# Altium footprint library SMD_Bauteile.PcbLib: 355 footprints (part 21 of 23)
Each footprint in its own frame and in the unit in brackets; x right, y up, seen from the top. Pads: shape width x height; smd on the part's side, far side on the other; paste and mask are expansions set on the pad; w line width, h text height; cw(c..) or ccw(c..) is an arc to the next point about the centre after c.
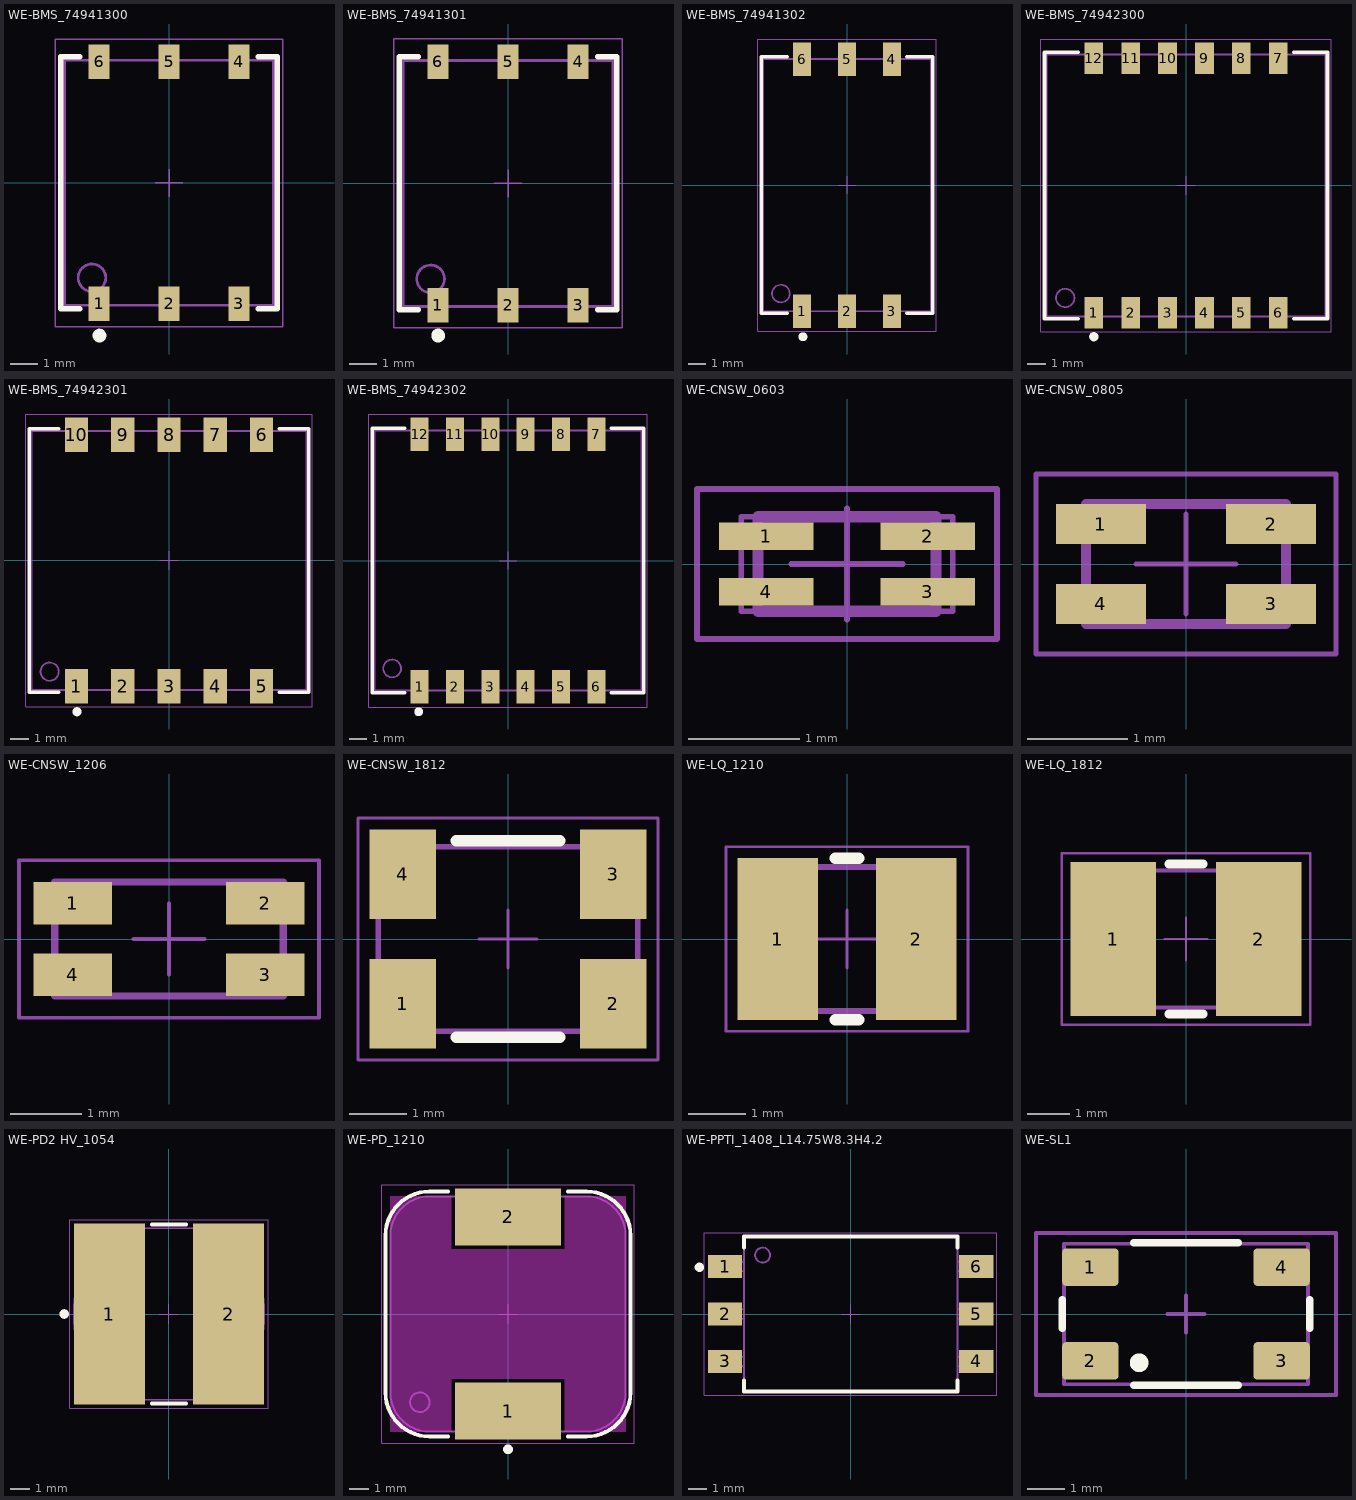
[diagram p20: the footprints below, top view; thin cyan lines are the x and y axes]

## WE-BMS_74941300 [mm] "SMT transformer, body 7.60x9.50mm"
height 5.75
pads (6):
  rect 0.76x1.25 smd: 1(-2.54,-4.4) 2(0,-4.4) 3(2.54,-4.4) 4(2.54,4.4) 5(0,4.4) 6(-2.54,4.4)
Top Overlay:
  circle w0.25: c-2.525,-5.55 r0.125
  lines w0.2: -3.25,-4.575 -3.925,-4.575 -3.925,4.575 -3.25,4.575 ; 3.25,-4.575 3.925,-4.575 3.925,4.575 3.25,4.575
Bottom Designator:
  lines w0.05: -0.5,0 0.5,0 ; 0,-0.5 0,0.5 ; -4.125,-5.225 -4.125,5.225 4.125,5.225 4.125,-5.225 -4.125,-5.225
Top Courtyard (Mech14):
  circle w0.1: c-2.8,-3.45 r0.5
  lines w0.1: -3.8,-4.45 3.8,-4.45 3.8,4.45 -3.8,4.45 -3.8,-4.45
Mechanical 18:
  circle w0.1: c-2.8,-3.45 r0.5
  lines w0.1: -3.8,-4.45 -3.8,4.45 3.8,4.45 3.8,-4.45 -3.8,-4.45
Top 3D Body:
  text ".Designator" at -7.498,-0.5 h1.5
3D body "74941300.stp": height 5.41, standoff 0, extent -3.8,-4.725 3.8,4.725

## WE-BMS_74941301 [mm] "SMT transformer, body 7.60x9.50mm"
height 5.75
pads (6):
  rect 0.76x1.25 smd: 1(-2.54,-4.4) 2(0,-4.4) 3(2.54,-4.4) 4(2.54,4.4) 5(0,4.4) 6(-2.54,4.4)
Top Overlay:
  circle w0.25: c-2.525,-5.5 r0.125
  lines w0.2: -3.25,-4.575 -3.925,-4.575 -3.925,4.575 -3.25,4.575 ; 3.25,-4.575 3.925,-4.575 3.925,4.575 3.25,4.575
Bottom Designator:
  lines w0.05: -0.5,0 0.5,0 ; 0,-0.5 0,0.5 ; -4.125,-5.225 4.125,-5.225 4.125,5.225 -4.125,5.225 -4.125,-5.225
Top Courtyard (Mech14):
  circle w0.1: c-2.8,-3.45 r0.5
  lines w0.1: -3.8,-4.45 -3.8,4.45 3.8,4.45 3.8,-4.45 -3.8,-4.45
Mechanical 18:
  circle w0.1: c-2.8,-3.45 r0.5
  lines w0.1: -3.8,-4.45 3.8,-4.45 3.8,4.45 -3.8,4.45 -3.8,-4.45
Top 3D Body:
  text ".Designator" at -7.498,-0.5 h1.5
3D body "74941301.stp": height 5.41, standoff 0, extent -3.8,-4.725 3.8,4.725

## WE-BMS_74941302 [mm] "SMT transformer, body 9.50x15.40mm"
height 3.7
pads (6):
  rect 1.02x1.89 smd: 1(-2.54,-7.145) 2(0,-7.145) 3(2.54,-7.145) 4(2.54,7.145) 5(0,7.145) 6(-2.54,7.145)
Top Overlay:
  circle w0.25: c-2.5,-8.6 r0.125
  lines w0.2: -3.4,-7.275 -4.875,-7.275 -4.875,7.275 -3.4,7.275 ; 3.4,-7.275 4.875,-7.275 4.875,7.275 3.4,7.275
Bottom Designator:
  lines w0.05: -0.5,0 0.5,0 ; 0,-0.5 0,0.5 ; -5.075,-8.29 -5.075,8.29 5.075,8.29 5.075,-8.29 -5.075,-8.29
Top Courtyard (Mech14):
  circle w0.1: c-3.75,-6.15 r0.5
  lines w0.1: -4.75,-7.15 4.75,-7.15 4.75,7.15 -4.75,7.15 -4.75,-7.15
Mechanical 18:
  circle w0.1: c-3.75,-6.15 r0.5
  lines w0.1: -4.75,-7.15 -4.75,7.15 4.75,7.15 4.75,-7.15 -4.75,-7.15
Top 3D Body:
  text ".Designator" at -7.498,-0.5 h1.5
3D body "74941302.stp": height 3.35, standoff 0, extent -4.75,-7.65 4.75,7.65

## WE-BMS_74942300 [mm] "SMT transformer, body 15.10x14.70mm"
height 4.75
pads (12):
  rect 1.01x1.71 smd: 1(-5,-6.89) 2(-3,-6.89) 3(-1,-6.89) 4(1,-6.89) 5(3,-6.89) 6(5,-6.89) 7(5,6.89) 8(3,6.89) 9(1,6.89) 10(-1,6.89) 11(-3,6.89) 12(-5,6.89)
Top Overlay:
  circle w0.25: c-5,-8.2 r0.125
  lines w0.2: -5.85,-7.225 -7.675,-7.225 -7.675,7.225 -5.85,7.225 ; 5.85,-7.225 7.675,-7.225 7.675,7.225 5.85,7.225
Bottom Designator:
  lines w0.05: -0.5,0 0.5,0 ; 0,-0.5 0,0.5 ; -7.875,-7.945 -7.875,7.945 7.875,7.945 7.875,-7.945 -7.875,-7.945
Top Courtyard (Mech14):
  circle w0.1: c-6.55,-6.1 r0.5
  lines w0.1: -7.55,-7.1 -7.55,7.1 7.55,7.1 7.55,-7.1 -7.55,-7.1
Mechanical 18:
  circle w0.1: c-6.55,-6.1 r0.5
  lines w0.1: -7.55,-7.1 7.55,-7.1 7.55,7.1 -7.55,7.1 -7.55,-7.1
Top 3D Body:
  text ".Designator" at -7.498,-0.5 h1.5
3D body "74942300.stp": height 4.85, standoff 0, extent -7.55,-7.35 7.55,7.35

## WE-BMS_74942301 [mm] "SMT transformer, body 15.10x14.90mm"
height 3.7
pads (10):
  rect 1.27x1.89 smd: 1(-5.08,-6.895) 2(-2.54,-6.895) 3(0,-6.895) 4(2.54,-6.895) 5(5.08,-6.895) 6(5.08,6.895) 7(2.54,6.895) 8(0,6.895) 9(-2.54,6.895) 10(-5.08,6.895)
Top Overlay:
  circle w0.25: c-5.05,-8.3 r0.125
  lines w0.2: -6.05,-7.225 -7.675,-7.225 -7.675,7.225 -6.05,7.225 ; 6.05,-7.225 7.675,-7.225 7.675,7.225 6.05,7.225
Bottom Designator:
  lines w0.05: -0.5,0 0.5,0 ; 0,-0.5 0,0.5 ; -7.875,-8.04 7.875,-8.04 7.875,8.04 -7.875,8.04 -7.875,-8.04
Top Courtyard (Mech14):
  circle w0.1: c-6.55,-6.1 r0.5
  lines w0.1: -7.55,-7.1 -7.55,7.1 7.55,7.1 7.55,-7.1 -7.55,-7.1
Mechanical 18:
  circle w0.1: c-6.55,-6.1 r0.5
  lines w0.1: -7.55,-7.1 7.55,-7.1 7.55,7.1 -7.55,7.1 -7.55,-7.1
Top 3D Body:
  text ".Designator" at -7.498,-0.5 h1.5
3D body "74942301.stp": height 3.35, standoff 0, extent -7.55,-7.4 7.55,7.4

## WE-BMS_74942302 [mm] "SMT transformer, body 15.10x15.40mm"
height 3.7
pads (12):
  rect 1.02x1.89 smd: 1(-5,-7.145) 2(-3,-7.145) 3(-1,-7.145) 4(1,-7.145) 5(3,-7.145) 6(5,-7.145) 7(5,7.145) 8(3,7.145) 9(1,7.145) 10(-1,7.145) 11(-3,7.145) 12(-5,7.145)
Top Overlay:
  circle w0.25: c-5.05,-8.55 r0.125
  lines w0.2: -5.85,-7.475 -7.675,-7.475 -7.675,7.475 -5.85,7.475 ; 5.85,-7.475 7.675,-7.475 7.675,7.475 5.85,7.475
Bottom Designator:
  lines w0.05: -0.5,0 0.5,0 ; 0,-0.5 0,0.5 ; -7.875,-8.29 -7.875,8.29 7.875,8.29 7.875,-8.29 -7.875,-8.29
Top Courtyard (Mech14):
  circle w0.1: c-6.55,-6.1 r0.5
  lines w0.1: -7.55,-7.35 -7.55,7.35 7.55,7.35 7.55,-7.35 -7.55,-7.35
Mechanical 18:
  circle w0.1: c-6.55,-6.1 r0.5
  lines w0.1: -7.55,-7.35 7.55,-7.35 7.55,7.35 -7.55,7.35 -7.55,-7.35
Top 3D Body:
  text ".Designator" at -7.498,-0.5 h1.5
3D body "74942302.stp": height 3.35, standoff 0, extent -7.55,-7.65 7.55,7.65

## WE-CNSW_0603 [mm] "SMT Common Mode Line Filter, 4-leads, body 1.60x0.85mm"
height 1.1
pads (4):
  rect 0.85x0.25 smd: 1(-0.725,0.25) 2(0.725,0.25) 3(0.725,-0.25) 4(-0.725,-0.25)
Bottom Designator:
  lines w0.05: -0.5,0 0.5,0 ; 0,-0.5 0,0.5 ; -1.35,-0.675 -1.35,0.675 1.35,0.675 1.35,-0.675 -1.35,-0.675
Mechanical 18:
  lines w0.1: -0.8,-0.425 -0.8,0.425 0.8,0.425 0.8,-0.425 -0.8,-0.425
Top Component Center:
  lines w0.05: -0.95,-0.425 -0.95,0.425 0.95,0.425 0.95,-0.425 -0.95,-0.425
  text ".Designator" at -2.499,-0.167 h0.5
3D body "0603_744230xxx.stp": height 1.1, standoff 0, extent -0.8,-0.425 0.8,0.425

## WE-CNSW_0805 [mm] "SMT Common Mode Line Filter, 4-leads, body 2.00x1.20mm"
height 1.2
pads (4):
  rect 0.9x0.4 smd: 1(-0.85,0.4) 2(0.85,0.4) 3(0.85,-0.4) 4(-0.85,-0.4)
Bottom Designator:
  lines w0.05: -0.5,0 0.5,0 ; 0,-0.5 0,0.5 ; -1.5,-0.9 1.5,-0.9 1.5,0.9 -1.5,0.9 -1.5,-0.9
Mechanical 18:
  lines w0.1: -1,-0.6 -1,0.6 1,0.6 1,-0.6 -1,-0.6
Top Component Center:
  lines w0.1: -1,-0.6 -1,0.6 1,0.6 1,-0.6 -1,-0.6
  text ".Designator" at -2.499,-0.167 h0.5
3D body "744231xxx.stp": height 1.2, standoff 0, extent -1,-0.6 1,0.6

## WE-CNSW_1206 [mm] "SMT Common Mode Line Filter, 4-leads, body 3.20x1.60mm"
height 1.8
pads (4):
  rect 1.1x0.6 smd: 1(-1.35,0.5) 2(1.35,0.5) 3(1.35,-0.5) 4(-1.35,-0.5)
Bottom Designator:
  lines w0.05: -0.5,0 0.5,0 ; 0,-0.5 0,0.5 ; -2.1,-1.1 -2.1,1.1 2.1,1.1 2.1,-1.1 -2.1,-1.1
Mechanical 18:
  lines w0.1: -1.6,-0.8 1.6,-0.8 1.6,0.8 -1.6,0.8 -1.6,-0.8
Top Component Center:
  lines w0.1: -1.6,-0.8 1.6,-0.8 1.6,0.8 -1.6,0.8 -1.6,-0.8
  text ".Designator" at -3.499,-0.233 h0.7
3D body "744232xxx.stp": height 1.8, standoff 0, extent -1.6,-0.8 1.6,0.8

## WE-CNSW_1812 [mm] "SMT Common Mode Line Filter, 4-leads, body 4.50x3.20mm"
height 2.8
pads (4):
  rect 1.15x1.55 smd: 1(-1.825,-1.125) 2(1.825,-1.125) 3(1.825,1.125) 4(-1.825,1.125)
Top Overlay:
  lines w0.2: -0.9,-1.7 0.9,-1.7 ; -0.9,1.7 0.9,1.7
Bottom Designator:
  lines w0.05: -0.5,0 0.5,0 ; 0,-0.5 0,0.5 ; -2.6,-2.1 2.6,-2.1 2.6,2.1 -2.6,2.1 -2.6,-2.1
Mechanical 18:
  lines w0.1: -2.25,-1.6 -2.25,1.6 2.25,1.6 2.25,-1.6 -2.25,-1.6
Top Component Center:
  lines w0.1: -2.25,-1.6 -2.25,1.6 2.25,1.6 2.25,-1.6 -2.25,-1.6
  text ".Designator" at -4.998,-0.333 h1
3D body "744235xxx.stp": height 2.84, standoff -0.01, extent -2.25,-1.6 2.25,1.6

## WE-LQ_1210 [mm] "SMT Inductor, body 3.2x2.5mm"
height 2.3
pads (2):
  rect 1.4x2.8 smd: 1(-1.2,0) 2(1.2,0)
Top Overlay:
  lines w0.2: -0.2,-1.4 0.2,-1.4 ; -0.2,1.4 0.2,1.4
Mech Misc 1:
  lines w0.1: -1.6,-1.25 1.6,-1.25 1.6,1.25 -1.6,1.25 -1.6,-1.25
Mech 15:
  lines w0.05: -0.5,0 0.5,0 ; 0,-0.5 0,0.5 ; -2.1,-1.6 -2.1,1.6 2.1,1.6 2.1,-1.6 -2.1,-1.6
3D body "7440320018.stp": height 1.99, standoff -0.01, extent -1.6,-1.25 1.6,1.25

## WE-LQ_1812 [mm] "SMT Inductor, body 4.5x3.2mm"
height 2.9
pads (2):
  rect 2x3.6 smd: 1(-1.7,0) 2(1.7,0)
Top Overlay:
  lines w0.2: -0.4,-1.75 0.4,-1.75 ; -0.4,1.75 0.4,1.75
Mech Misc 1:
  lines w0.1: -2.25,-1.6 -2.25,1.6 2.25,1.6 2.25,-1.6 -2.25,-1.6
Mech 15:
  lines w0.05: -0.5,0 0.5,0 ; 0,-0.5 0,0.5 ; -2.9,-2 -2.9,2 2.9,2 2.9,-2 -2.9,-2
3D body "744045001.stp": height 2.59, standoff -0.01, extent -2.25,-1.6 2.25,1.6

## WE-PD2 HV_1054 [mm] "SMT High Voltage Power Inductor, 2-Leads, body 10.00x9.00mm"
height 5.9
pads (2):
  rect 3.75x9.5 smd: 1(-3.125,0) 2(3.125,0)
Top Overlay:
  circle w0.25: c-5.5,0 r0.125
  lines w0.2: -0.9,-4.7 0.9,-4.7 ; -0.9,4.7 0.9,4.7
Top 3D Body:
  circle w0.1: c-4.2,0 r0.35
  lines w0.1: -5,0 ccw(c-0.311,-0.183) -2.15,-4.5 2.15,-4.5 ccw(c0.311,-0.183) 5,0 ccw(c0.311,0.183) 2.15,4.5 -2.15,4.5 ccw(c-0.311,0.183) -5,0
Top Component Outline:
  circle w0.1: c-4.2,0 r0.35
  lines w0.1: -5,0 ccw(c-0.311,-0.183) -2.15,-4.5 2.15,-4.5 ccw(c0.311,-0.183) 5,0 ccw(c0.311,0.183) 2.15,4.5 -2.15,4.5 ccw(c-0.311,0.183) -5,0
Top Courtyard (Mech26):
  lines w0.05: -0.5,0 0.5,0 ; 0,-0.5 0,0.5 ; -5.2,-4.95 5.2,-4.95 5.2,4.95 -5.2,4.95 -5.2,-4.95
Top Designator:
  text ".Designator" at -7.498,-0.5 h1.5
3D body "IndPD2HV_1054.stp": height 5.4, standoff 0, extent -4.931,-4.5 4.931,4.502

## WE-PD_1210 [mm] "SMT Shielded Power Inductor, 2-leads, body 12x12mm"
height 10
pads (2):
  rect 5.4x2.9 smd: 1(0,-4.95) 2(0,4.95)
Top Layer keep-out:
  region: -6,6 -2.9,6 -2.9,3.3 2.9,3.3 2.9,6 6,6 6,-6 2.9,-6 2.9,-3.3 -2.9,-3.3 -2.9,-6 -6,-6
Top Overlay:
  circle w0.25: c0,-6.9 r0.125
  lines w0.2: -3.05,-6.25 -4,-6.25 cw(c-4,-4) -6.25,-4 -6.25,4 cw(c-4,4) -4,6.25 -3.05,6.25 ; 3.05,-6.25 4,-6.25 ccw(c4,-4) 6.25,-4 6.25,4 ccw(c4,4) 4,6.25 3.05,6.25
Bottom Designator:
  lines w0.05: -0.5,0 0.5,0 ; 0,-0.5 0,0.5 ; -6.45,-6.6 6.45,-6.6 6.45,6.6 -6.45,6.6 -6.45,-6.6
Top Courtyard (Mech14):
  circle w0.1: c-4.5,-4.5 r0.5
  lines w0.1: -6,-4 ccw(c-4,-4) -4,-6 4,-6 ccw(c4,-4) 6,-4 6,4 ccw(c4,4) 4,6 -4,6 ccw(c-4,4) -6,4 -6,-4
Mechanical 18:
  circle w0.1: c-4.5,-4.5 r0.5
  lines w0.1: -6,-4 ccw(c-4,-4) -4,-6 4,-6 ccw(c4,-4) 6,-4 6,4 ccw(c4,4) 4,6 -4,6 ccw(c-4,4) -6,4 -6,-4
Top 3D Body:
  text ".Designator" at -7.498,-0.5 h1.5
3D body "WE-PD_1210_m-base_7447709xx.stp": height 9.46, standoff 0, extent -6,-6 6,6

## WE-PPTI_1408_L14.75W8.3H4.2 [mm] "Push-Pull Transformer, SMT, body 14.75 x 8.3 mm"
height 4.2
pads (6):
  rect 1.82x1.22 smd: 1(-6.715,2.54) 2(-6.715,0) 3(-6.715,-2.54) 4(6.715,-2.54) 5(6.715,0) 6(6.715,2.54)
Top Overlay:
  circle w0.25: c-8.1,2.5 r0.125
  lines w0.2: -5.715,-3.55 -5.715,-4.15 5.715,-4.15 5.715,-3.55 ; -5.715,3.55 -5.715,4.15 5.715,4.15 5.715,3.55
Top Component Center:
  lines w0.05: -0.5,0 0.5,0 ; 0,-0.5 0,0.5
Top Component Outline:
  circle w0.1: c-4.715,3.15 r0.4
  lines w0.1: -5.715,-2.795 -7.375,-2.795 -7.375,-2.285 -5.715,-2.285 ; -5.715,-0.255 -7.375,-0.255 -7.375,0.255 -5.715,0.255 ; -5.715,2.285 -7.375,2.285 -7.375,2.795 -5.715,2.795 ; 5.715,-2.795 7.375,-2.795 7.375,-2.285 5.715,-2.285 ; 5.715,-0.255 7.375,-0.255 7.375,0.255 5.715,0.255 ; 5.715,2.285 7.375,2.285 7.375,2.795 5.715,2.795 ; -5.715,-4.15 -5.715,4.15 5.715,4.15 5.715,-4.15 -5.715,-4.15
Top Courtyard (Mech26):
  lines w0.05: -7.825,-4.35 -7.825,4.35 7.825,4.35 7.825,-4.35 -7.825,-4.35
Top Designator:
  text ".Designator" at -7.498,-0.5 h1.5
3D body "Download_STP_250-1268 (rev1).STEP": height 4.09, standoff 0, extent -7.125,-4.015 7.125,4.015

## WE-SL1 [mm] "SMD Inductor, 4-Leads, Body 3.8 x 6.5 mm"
height 1.8
pads (4):
  rrect20% 1.5x1 smd: 1(-2.55,1.25) 2(-2.55,-1.25) 3(2.55,-1.25) 4(2.55,1.25)
Top Overlay:
  circle w0.25: c-1.25,-1.3 r0.125
  lines w0.2: -3.302,-0.381 -3.302,0.381 ; -1.397,-1.905 1.397,-1.905 ; -1.397,1.9 1.397,1.895 ; 3.3,-0.381 3.3,0.381
Top Component Center:
  lines w0.1: -0.5,0 0.5,0 ; 0,-0.5 0,0.5
Top Component Outline:
  lines w0.1: -3.25,-1.875 3.25,-1.875 3.25,1.875 -3.25,1.875 -3.25,-1.875
Top Courtyard (Mech26):
  lines w0.1: -4,-2.159 4,-2.159 4,2.159 -4,2.159 -4,-2.159
3D body "744212510.stp": height 1.64, standoff -0.02, extent -2.6,-1.8 2.6,1.8